# Altium footprint library SG_PCB_HOLE_Connector.PcbLib: 133 footprints (part 1 of 9)
Each footprint in its own frame and in the unit in brackets; x right, y up, seen from the top. Pads: shape width x height; smd on the part's side, far side on the other; paste and mask are expansions set on the pad; w line width, h text height; cw(c..) or ccw(c..) is an arc to the next point about the centre after c.
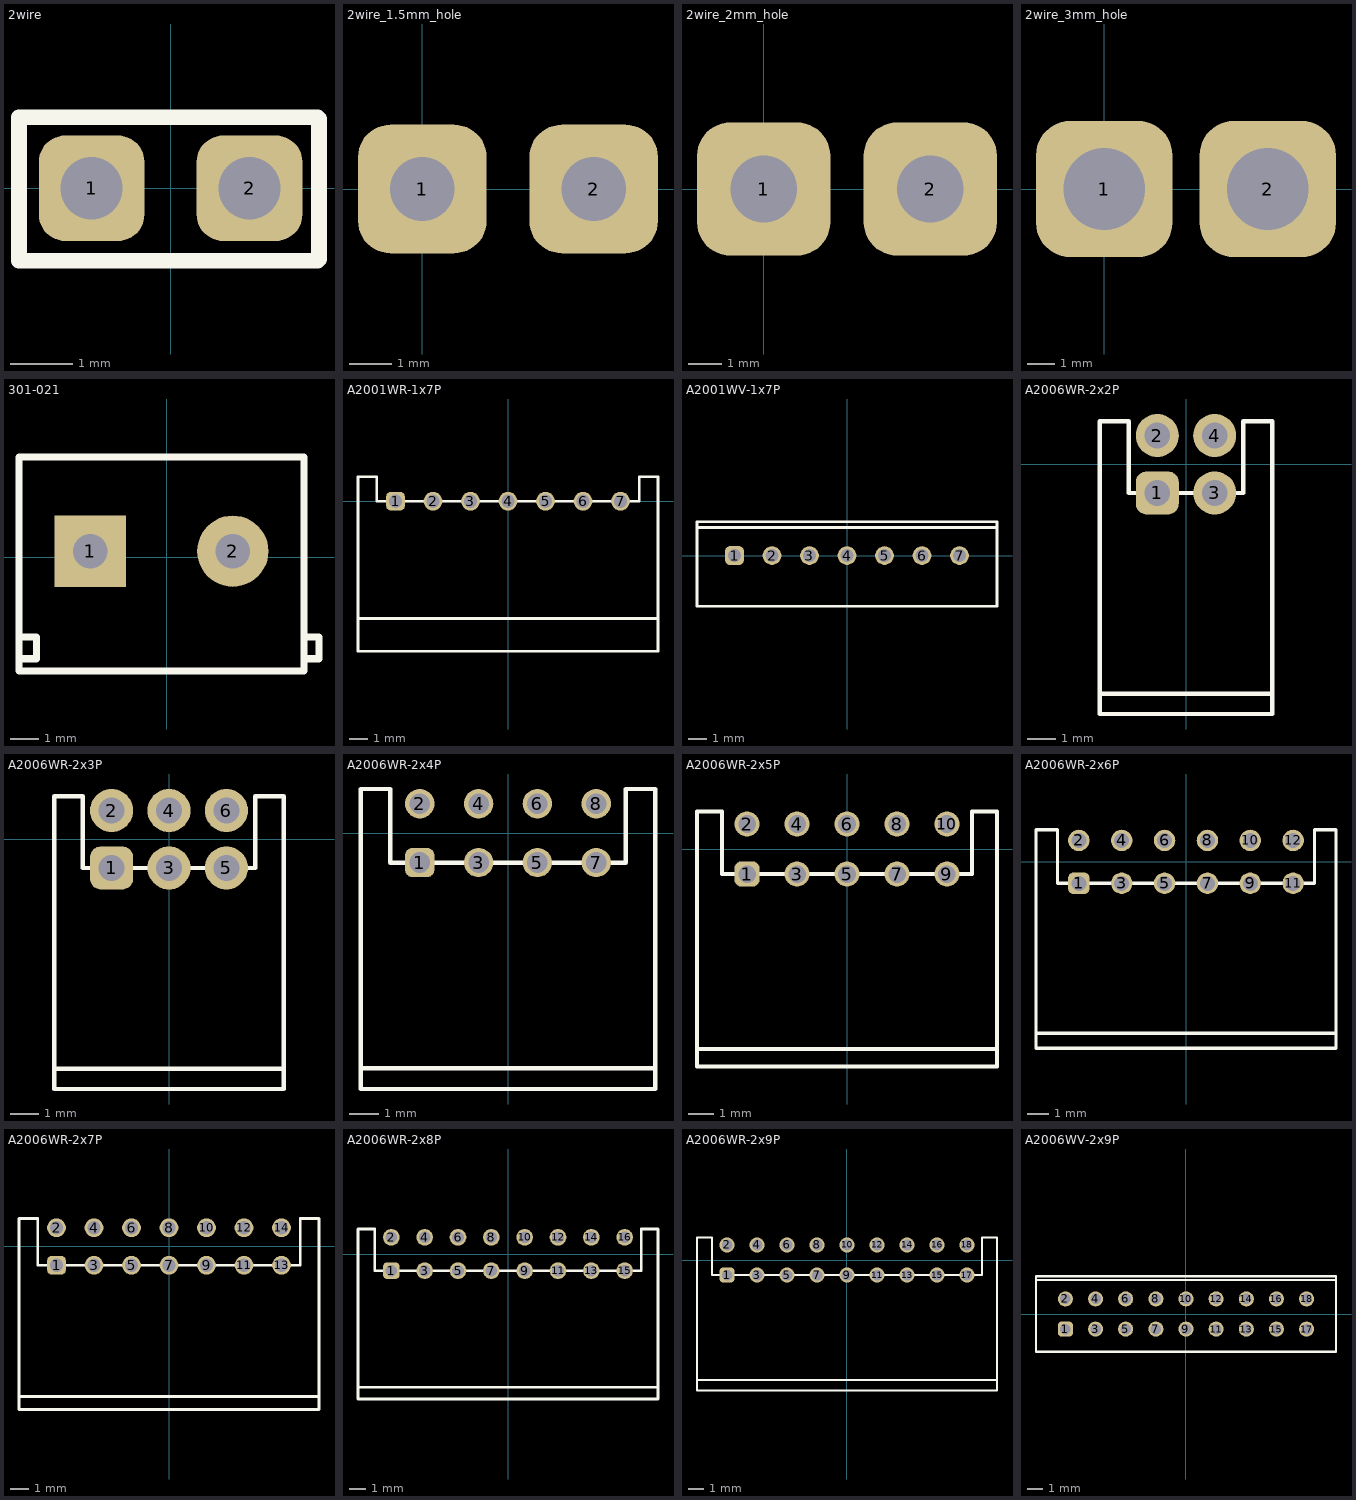
[diagram p0: the footprints below, top view; thin cyan lines are the x and y axes]

## 2wire [mm]
height 12
pads (2):
  rrect50% 1.7x1.7 hole 1: 1(-1.27,0) 2(1.27,0)
Top Overlay:
  lines w0.254: -2.438,-1.168 -2.438,1.143 2.362,1.143 2.388,1.118 2.388,-1.143 2.362,-1.168 -2.438,-1.168

## 2wire_1.5mm_hole [mm]
height 12
pads (2):
  rrect50% 3x3 hole 1.5: 1(0,0) 2(4,0)

## 2wire_2mm_hole [mm]
height 12
pads (2):
  rrect50% 4x4 hole 2: 1(0,0) 2(5,0)

## 2wire_3mm_hole [mm]
height 12
pads (2):
  rrect50% 5x5 hole 3: 1(0,0) 2(6,0)

## 301-021 [mm] "301-021 Клеммник"
pads (2):
  rect 2.5x2.5 hole 1.2: 1(-2.688,0.216)
  round 2.5 hole 1.2: 2(2.312,0.216)
Top Overlay:
  lines w0.254: -5.08,-3.556 -4.572,-3.556 -4.572,-2.794 -5.08,-2.794 ; 4.826,-3.556 5.334,-3.556 5.334,-2.794 4.826,-2.794 ; -5.188,-3.984 4.812,-3.984 4.812,3.516 -5.188,3.516 -5.188,-3.984
3D body "301-021.stp": height 10, standoff -3.46, extent -5.088,-3.884 5.412,3.716

## A2001WR-1x7P [mm] "PLD-7-2.0"
pads (7):
  rrect50% 1x1 / inner rrect50% 1.5x1.5 / far side rrect50% 1.6x1.6 hole 0.7: 1(-6,0)
  round 1 / inner round 1.5 / far side round 1.6 hole 0.7: 2(-4,0) 3(-2,0) 4(0,0) 5(2,0) 6(4,0) 7(6,0)
Top Overlay:
  lines w0.152: -8,-6.25 8,-6.25 ; -8,-8 -5.1,-8 8,-8 8,1.3 7,1.3 7,0 -1,0 -7,0 -7,1.3 -8,1.3 -8,0 -8,-8
3D body: height 4.85, standoff 0, extent -8,-8 8,1.3

## A2001WV-1x7P [mm] "PLD-7-2.0"
pads (7):
  rrect50% 1x1 / inner rrect50% 1.5x1.5 / far side rrect50% 1.6x1.6 hole 0.7: 1(-6,0)
  round 1 / inner round 1.5 / far side round 1.6 hole 0.7: 2(-4,0) 3(-2,0) 4(0,0) 5(2,0) 6(4,0) 7(6,0)
Top Overlay:
  lines w0.152: -8,1.5 8,1.5 ; -8,-2.7 8,-2.7 8,1.8 -8,1.8 -8,-2.7
3D body: height 6.1, standoff 0, extent -8,-2.7 8,1.8

## A2006WR-2x2P [mm] "PLD-10-2.0"
pads (4):
  rrect50% 1.5x1.5 hole 0.9: 1(-1,-1)
  round 1.5 hole 0.9: 2(-1,1) 3(1,-1) 4(1,1)
Top Overlay:
  lines w0.152: -3,-8 3,-8 ; -3,-8.7 3,-8.7 3,-3 3,1.5 2,1.5 2,-1 -2,-1 -2,1.5 -3,1.5 -3,-1 -3,-8.7
3D body: height 5, standoff 0, extent -3,-8.7 3,1.5

## A2006WR-2x3P [mm] "PLD-10-2.0"
pads (6):
  rrect50% 1.5x1.5 hole 0.9: 1(-2,-1)
  round 1.5 hole 0.9: 2(-2,1) 3(0,-1) 4(0,1) 5(2,-1) 6(2,1)
Top Overlay:
  lines w0.152: -4,-8 4,-8 ; -4,-8.7 -4,-1 -4,1.5 -3,1.5 -3,-1 3,-1 3,1.5 4,1.5 4,-1 4,-8.7 -4,-8.7
3D body: height 5, standoff 0, extent -4,-8.7 4,1.5

## A2006WR-2x4P [mm] "PLD-10-2.0"
pads (8):
  rrect50% 1x1 / inner rrect50% 1.5x1.5 / far side rrect50% 1.6x1.6 hole 0.7: 1(-3,-1)
  round 1 / inner round 1.5 / far side round 1.6 hole 0.7: 2(-3,1) 3(-1,-1) 4(-1,1) 5(1,-1) 6(1,1) 7(3,-1) 8(3,1)
Top Overlay:
  lines w0.152: -5,-8 5,-8 ; -5,-8.7 -5,-1 -5,1.5 -4,1.5 -4,-1 2,-1 4,-1 4,1.5 5,1.5 5,-3 5,-8.7 -5,-8.7
3D body: height 5, standoff 0, extent -5,-8.7 5,1.5

## A2006WR-2x5P [mm] "PLD-10-2.0"
pads (10):
  rrect50% 1x1 / inner rrect50% 1.5x1.5 / far side rrect50% 1.6x1.6 hole 0.7: 1(-4,-1)
  round 1 / inner round 1.5 / far side round 1.6 hole 0.7: 2(-4,1) 3(-2,-1) 4(-2,1) 5(0,-1) 6(0,1) 7(2,-1) 8(2,1) 9(4,-1) 10(4,1)
Top Overlay:
  lines w0.152: -6,-8 -4,-8 6,-8 ; -6,-8 -6,-1 -6,1.5 -5,1.5 -5,-1 0.8,-1 5,-1 5,1.5 6,1.5 6,-3 6,-8 ; -6,-8 -6,-8.7 4.5,-8.7 6,-8.7 6,-8
3D body "A2211WR-2X05P.STEP": height 5, standoff -2, extent -6,-8 6,1.5

## A2006WR-2x6P [mm] "PLD-10-2.0"
pads (12):
  rrect50% 1x1 / inner rrect50% 1.5x1.5 / far side rrect50% 1.6x1.6 hole 0.7: 1(-5,-1)
  round 1 / inner round 1.5 / far side round 1.6 hole 0.7: 2(-5,1) 3(-3,-1) 4(-3,1) 5(-1,-1) 6(-1,1) 7(1,-1) 8(1,1) 9(3,-1) 10(3,1) 11(5,-1) 12(5,1)
Top Overlay:
  lines w0.152: -7,-8 7,-8 ; -6.6,-8.7 -6.4,-8.7 ; -7,-8.7 -7,-1 -7,1.5 -6,1.5 -6,-1 0,-1 6,-1 6,1.5 7,1.5 7,-0.2 7,-8.7 -5,-8.7 -7,-8.7
3D body: height 5, standoff 0, extent -7,-8.7 7,1.5

## A2006WR-2x7P [mm] "PLD-10-2.0"
pads (14):
  rrect50% 1x1 / inner rrect50% 1.5x1.5 / far side rrect50% 1.6x1.6 hole 0.7: 1(-6,-1)
  round 1 / inner round 1.5 / far side round 1.6 hole 0.7: 2(-6,1) 3(-4,-1) 4(-4,1) 5(-2,-1) 6(-2,1) 7(0,-1) 8(0,1) 9(2,-1) 10(2,1) 11(4,-1) 12(4,1) 13(6,-1) 14(6,1)
Top Overlay:
  lines w0.152: -8,-8 8,-8 ; -7.6,-8.7 -7.4,-8.7 ; -8,-8.7 -8,-1 -8,1.5 -7,1.5 -7,-1 -1,-1 7,-1 7,1.5 8,1.5 8,-8.7 -6,-8.7 -8,-8.7
3D body: height 5, standoff 0, extent -8,-8.7 8,1.5

## A2006WR-2x8P [mm] "PLD-10-2.0"
pads (16):
  rrect50% 1x1 / inner rrect50% 1.5x1.5 / far side rrect50% 1.6x1.6 hole 0.7: 1(-7,-1)
  round 1 / inner round 1.5 / far side round 1.6 hole 0.7: 2(-7,1) 3(-5,-1) 4(-5,1) 5(-3,-1) 6(-3,1) 7(-1,-1) 8(-1,1) 9(1,-1) 10(1,1) 11(3,-1) 12(3,1) 13(5,-1) 14(5,1) 15(7,-1) 16(7,1)
Top Overlay:
  lines w0.152: -9,-8 9,-8 ; -8.6,-8.7 -8.4,-8.7 ; -9,-8.7 -7,-8.7 9,-8.7 9,-0.2 9,1.5 8,1.5 8,-1 -2,-1 -8,-1 -8,1.5 -9,1.5 -9,-1 -9,-8.7
3D body: height 5, standoff 0, extent -9,-8.7 9,1.5

## A2006WR-2x9P [mm] "PLD-18-2.0"
pads (18):
  rrect50% 1x1 / inner rrect50% 1.5x1.5 / far side rrect50% 1.6x1.6 hole 0.7: 1(-8,-1)
  round 1 / inner round 1.5 / far side round 1.6 hole 0.7: 2(-8,1) 3(-6,-1) 4(-6,1) 5(-4,-1) 6(-4,1) 7(-2,-1) 8(-2,1) 9(0,-1) 10(0,1) 11(2,-1) 12(2,1) 13(4,-1) 14(4,1) 15(6,-1) 16(6,1) 17(8,-1) 18(8,1)
Top Overlay:
  lines w0.152: -10,-8 10,-8 ; -9.6,-8.7 -9.4,-8.7 ; -10,-8.7 -10,-1 -10,1.5 -9,1.5 -9,-1 -3,-1 9,-1 9,1.5 10,1.5 10,-2.2 10,-8.7 -8,-8.7 -10,-8.7
3D body: height 5, standoff 0, extent -10,-8.7 10,1.5

## A2006WV-2x9P [mm] "PLD-18-2.0"
pads (18):
  rrect50% 1x1 / inner rrect50% 1.5x1.5 / far side rrect50% 1.6x1.6 hole 0.7: 1(-8,-1)
  round 1 / inner round 1.5 / far side round 1.6 hole 0.7: 2(-8,1) 3(-6,-1) 4(-6,1) 5(-4,-1) 6(-4,1) 7(-2,-1) 8(-2,1) 9(0,-1) 10(0,1) 11(2,-1) 12(2,1) 13(4,-1) 14(4,1) 15(6,-1) 16(6,1) 17(8,-1) 18(8,1)
Top Overlay:
  lines w0.152: -9.95,2.25 9.95,2.25 ; -9.95,-2.5 -9.95,2.5 9.95,2.5 9.95,-2.5 -9.95,-2.5
3D body: height 6.5, standoff 0, extent -9.95,-2.5 9.95,2.5